# Altium footprint library rcl.PCBLIB: 513 footprints (part 31 of 33)
Each footprint in its own frame and in the unit in brackets; x right, y up, seen from the top. Pads: shape width x height; smd on the part's side, far side on the other; paste and mask are expansions set on the pad; w line width, h text height; cw(c..) or ccw(c..) is an arc to the next point about the centre after c.
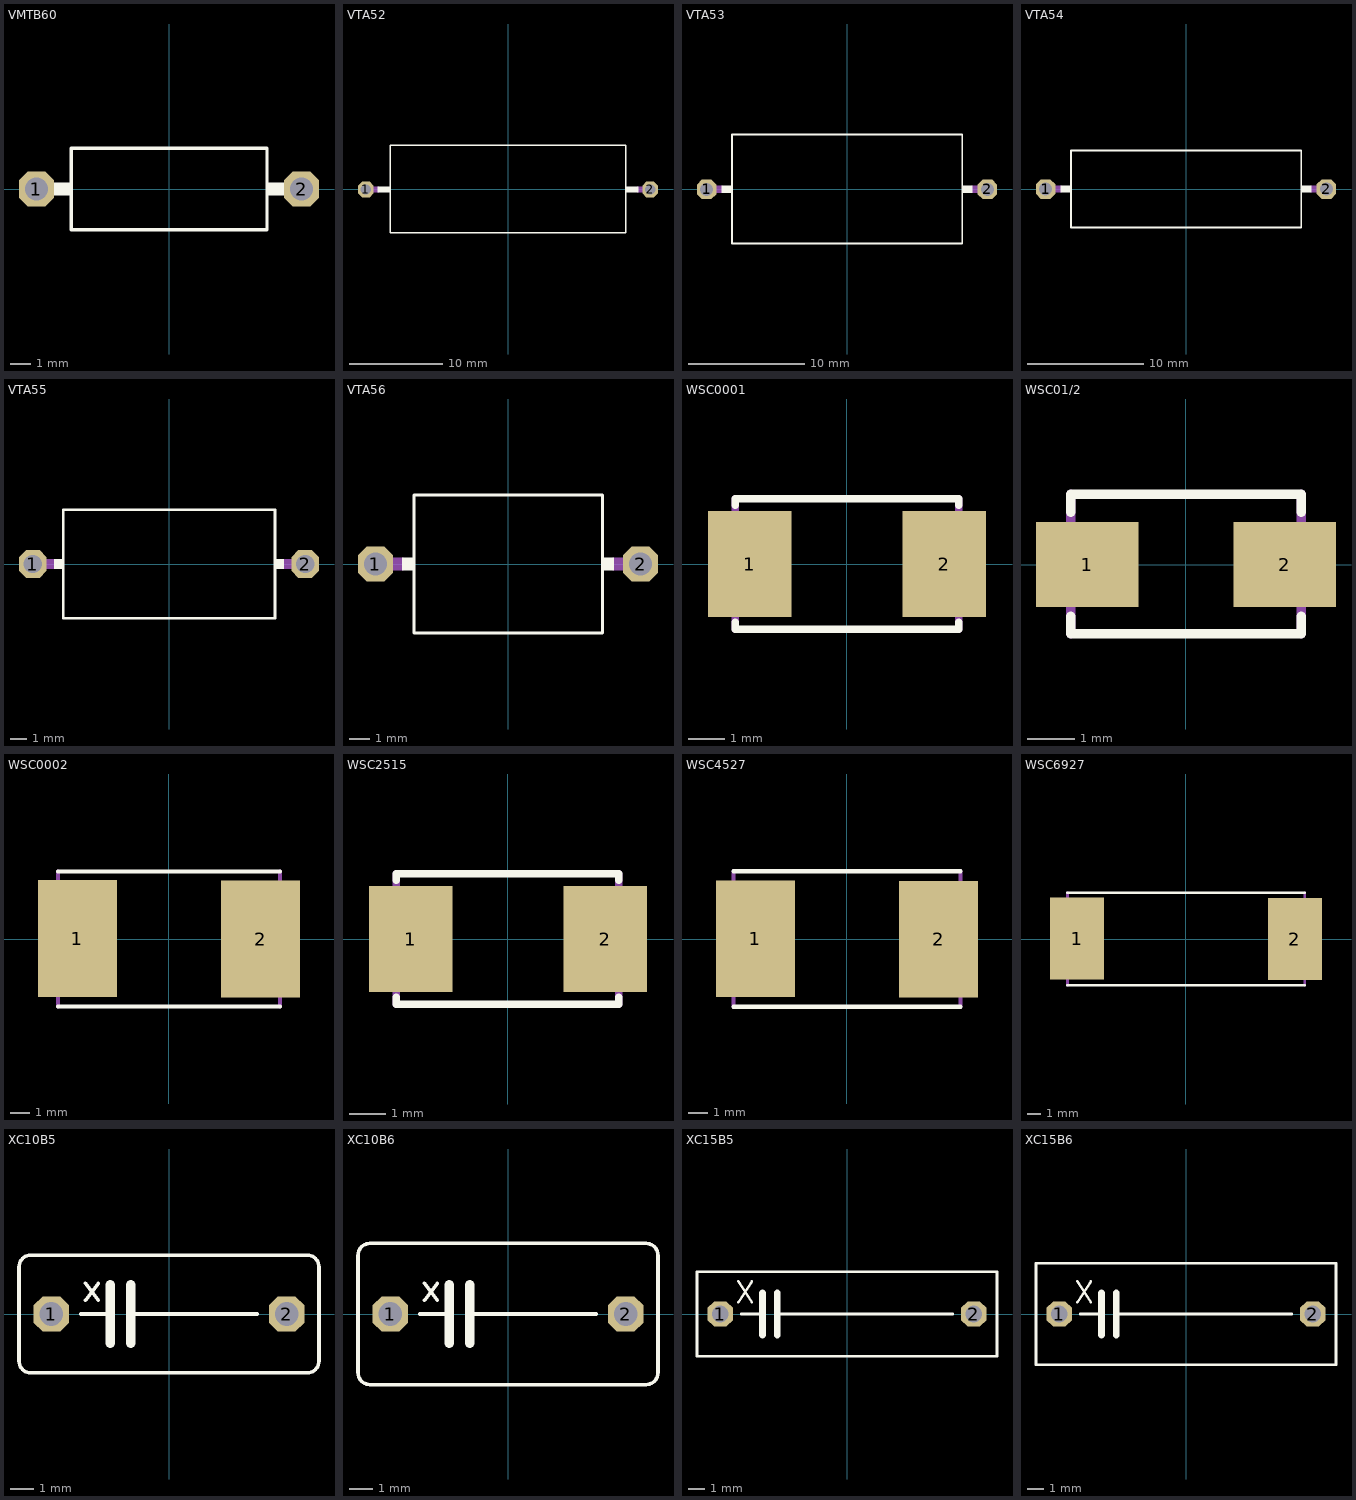
[diagram p30: the footprints below, top view; thin cyan lines are the x and y axes]

## VMTB60 [mil]
pads (2):
  oct 66x66 hole 44: 1(-250,0) 2(250,0)
Top Overlay:
  rectangle: 183,-12 220,12
  rectangle: -219.88,-12 -182.38,12
  lines w6: -184.55,-76.77 185,-76.77 185,77 -184.55,77 -184.55,-76.77
Mechanical 4:
  lines w24: -250,0 -219.88,0 ; 220,0 250,0

## VTA52 [mil]
pads (2):
  oct 66x66 hole 44: 1(-600,0) 2(600,0)
Top Overlay:
  rectangle: 495,-12 550,12
  rectangle: -550,-12 -494.78,12
  lines w6: -496.95,-183.07 497,-183.07 497,1 497,187 -496.95,187 -496.95,1 -496.95,-183.07
Mechanical 4:
  lines w24: -600,0 -550,0 ; 550,0 600,0

## VTA53 [mil]
pads (2):
  oct 66x66 hole 44: 1(-475,0) 2(475,0)
Top Overlay:
  rectangle: 388,-12 425,12
  rectangle: -425,-12 -387.5,12
  lines w6: -389.67,-184.06 390,-184.06 390,0 390,186 -389.67,186 -389.67,0 -389.67,-184.06
Mechanical 4:
  lines w24: -475,0 -425,0 ; 425,0 475,0

## VTA54 [mil]
pads (2):
  oct 66x66 hole 44: 1(-475,0) 2(475,0)
Top Overlay:
  rectangle: 388,-12 425,12
  rectangle: -425,-12 -387.5,12
  lines w6: -389.67,-129.92 390,-129.92 390,0 390,130 -389.67,130 -389.67,0 -389.67,-129.92
Mechanical 4:
  lines w24: -475,0 -425,0 ; 425,0 475,0

## VTA55 [mil]
pads (2):
  oct 66x66 hole 44: 1(-325,0) 2(325,0)
Top Overlay:
  rectangle: 250,-12 275,12
  rectangle: -275,-12 -250,12
  lines w6: -252.17,-129.92 253,-129.92 253,0 253,130 -252.17,130 -252.17,0 -252.17,-129.92
Mechanical 4:
  lines w24: -325,0 -275,0 ; 275,0 325,0

## VTA56 [mil]
pads (2):
  oct 66x66 hole 44: 1(-250,0) 2(250,0)
Top Overlay:
  rectangle: 175,-12 200,12
  rectangle: -200,-12 -175,12
  lines w6: -177.17,-129.92 178,-129.92 178,0 178,130 -177.17,130 -177.17,0 -177.17,-129.92
Mechanical 4:
  lines w24: -250,0 -200,0 ; 200,0 250,0

## WSC0001 [mil]
pads (2):
  rect 91x115 smd: 1(-105.31,0) 2(106,0)
Top Overlay:
  lines w8: -121.06,-63.23 -121.06,-70.87 122,-70.87 122,-63.23 ; -121.06,64 -121.06,71 122,71 122,64
Mechanical 4:
  lines w8: -121.06,-70.87 -121.06,71 ; 122,-70.87 122,71

## WSC01/2 [mil]
pads (2):
  rect 86x71 smd: 1(-82.68,0) 2(83,0)
Top Overlay:
  lines w8: -96.46,-43.54 -96.46,-58.07 97,-58.07 97,-43.54 ; -96.46,44 -96.46,59 97,59 97,44
Mechanical 4:
  lines w8: -96.46,-58.07 -96.46,59 ; 97,-58.07 97,59

## WSC0002 [mil]
pads (2):
  rect 156x230 smd: 1(-180.12,1) 2(181,0)
Top Overlay:
  lines w8: -218.5,-132.87 219,-132.87 ; -218.5,133 219,133
Mechanical 4:
  lines w8: -218.5,-132.87 -218.5,133 ; 219,-132.87 219,133

## WSC2515 [mil]
pads (2):
  rect 91x115 smd: 1(-105.31,0) 2(106,0)
Top Overlay:
  lines w8: -121.06,-63.23 -121.06,-70.87 121,-70.87 121,-63.23 ; -121.06,64 -121.06,71 121,71 121,64
Mechanical 4:
  lines w8: -121.06,-70.87 -121.06,71 ; 121,-70.87 121,71

## WSC4527 [mil]
pads (2):
  rect 156x230 smd: 1(-180.12,1) 2(181,0)
Top Overlay:
  lines w8: -223.43,-132.87 224,-132.87 ; -223.43,134 224,134
Mechanical 4:
  lines w8: -223.43,-132.87 -223.43,134 ; 224,-132.87 224,134

## WSC6927 [mil]
pads (2):
  rect 156x236 smd: 1(-312.99,1) 2(313,0)
Top Overlay:
  lines w8: -340.55,-132.87 341,-132.87 ; -340.55,133 341,133
Mechanical 4:
  lines w8: -340.55,-132.87 -340.55,133 ; 341,-132.87 341,133

## XC10B5 [mil]
pads (2):
  oct 60x60 hole 40: 1(-200,0) 2(200,0)
Top Overlay:
  lines w6: -150,0 -100,0 ; -142,23 -120,52 ; -142,52 -120,23 ; -65,0 150,0 ; -255,-80 ccw(c-235,-80) -235,-100 235,-100 ccw(c235,-80) 255,-80 255,80 ccw(c235,80) 235,100 -235,100 ccw(c-235,80) -255,80 -255,-80
  lines w16: -100,-50 -100,0 -100,50 ; -65,-50 -65,0 -65,50

## XC10B6 [mil]
pads (2):
  oct 60x60 hole 40: 1(-200,0) 2(200,0)
Top Overlay:
  lines w6: -150,0 -100,0 ; -142,23 -120,52 ; -142,52 -120,23 ; -65,0 150,0 ; -255,-100 ccw(c-235,-100) -235,-120 235,-120 ccw(c235,-100) 255,-100 255,100 ccw(c235,100) 235,120 -235,120 ccw(c-235,100) -255,100 -255,-100
  lines w16: -100,-50 -100,0 -100,50 ; -65,-50 -65,0 -65,50

## XC15B5 [mil]
pads (2):
  oct 60x60 hole 40: 1(-300,0) 2(300,0)
Top Overlay:
  lines w6: -257,28 -225,77 ; -257,77 -225,28 ; -250,0 -200,0 ; -165,0 250,0 ; -355,-100 355,-100 355,100 -355,100 -355,-100
  lines w16: -200,-50 -200,0 -200,50 ; -165,-50 -165,0 -165,50

## XC15B6 [mil]
pads (2):
  oct 60x60 hole 40: 1(-300,0) 2(300,0)
Top Overlay:
  lines w6: -257,28 -225,77 ; -257,77 -225,28 ; -250,0 -200,0 ; -165,0 250,0 ; -355,-120 355,-120 355,120 -355,120 -355,-120
  lines w16: -200,-50 -200,0 -200,50 ; -165,-50 -165,0 -165,50